# Altium schematic symbol library BARKO_SCHLIB.SchLib: 1064 symbols (part 11 of 11)
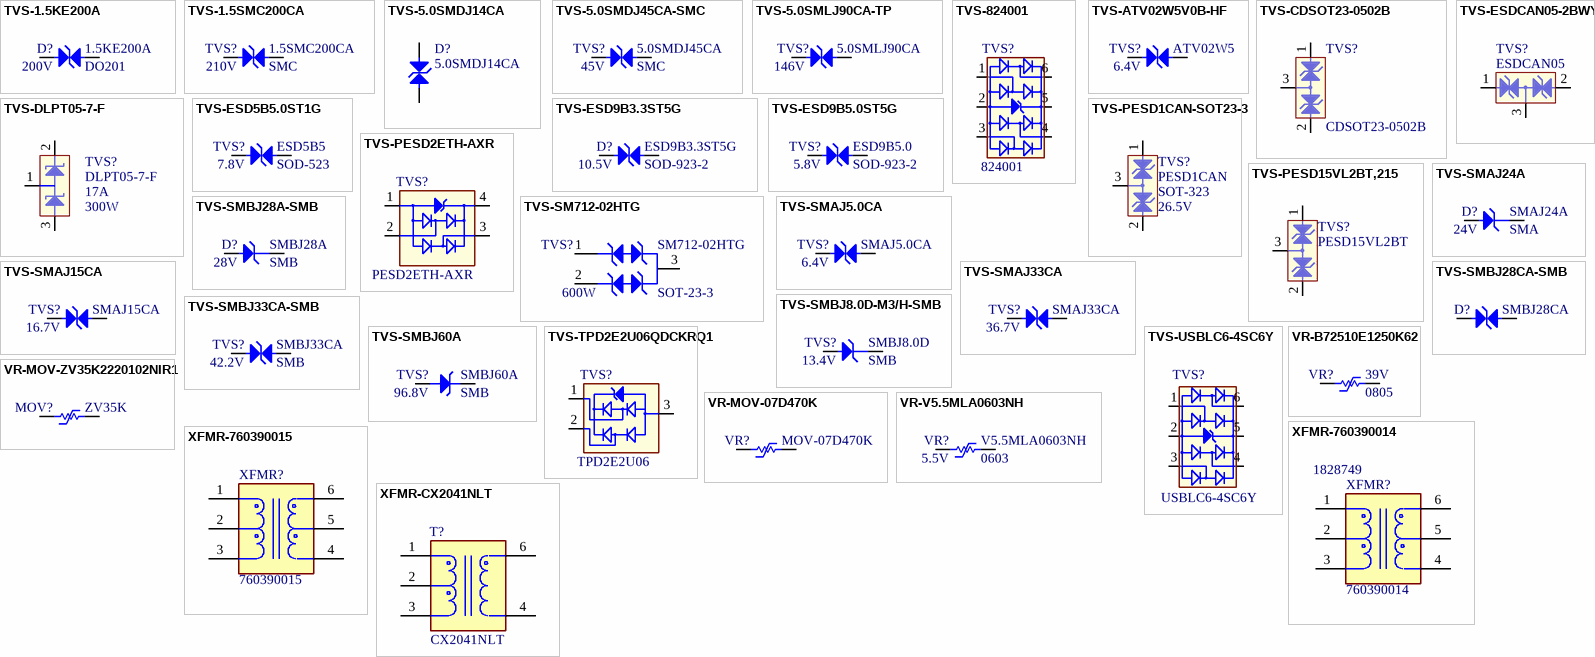
[diagram p51: symbols TVS-1.5KE200A to XFMR-CX2041NLT]

## TVS-USBLC6-4SC6Y
designator TVS?, comment USBLC6-4SC6Y
TVS DIODE 5.25V 17V SOT23-6; Manufacturer: STMicroelectronics; Direction: Unidirectional; Capacitance: 4pF; Min Breakdown Voltage: 6V; Power Line Protection: Yes; Leakage Current: 150nA; Peak Pulse Current: 5A; Number of Bidirectional Channels: 4; Supplier 1: Digi-Key; Supplier Part Number 1: 497-11883-1-ND; Manufacturer Part Number: USBLC6-4SC6Y; Stock: 26750; Pricing: 1=0.87, 10=0.737, 100=0.5762, 500=0.469, 1000=0.3752 (USD); RoHS: Yes; Mount: Surface Mount; Case/Package: SOT-23-6; Number of Pins: 6; Min Operating Temperature: -40°C; Max Operating Temperature: 150°C; Clamping Voltage: 17V; Package Quantity: 1; Packaging: Tape and Reel; Reverse Standoff Voltage: 5.25V; Length: 3mm; Depth: 1.75mm; Radiation Hardening: No; Lead Free: Lead Free; ComponentLink1URL: https://datasheet.ciiva.com/25956/dm00055251-25956716.pdf?src-supplier=Avnet+Europe; ComponentLink1Description: https://datasheet.ciiva.com/25956/dm00055251-25956716.pdf?src-supplier=Avnet+Europe; ComponentLink2URL: https://datasheet.ciiva.com/339/dm00055251-339152.pdf?src-supplier=Digi-Key; ComponentLink2Description: https://datasheet.ciiva.com/339/dm00055251-339152.pdf?src-supplier=Digi-Key; ComponentLink3URL: https://datasheet.ciiva.com/339/dm00055251-339153.pdf?src-supplier=Digi-Key; ComponentLink3Description: https://datasheet.ciiva.com/339/dm00055251-339153.pdf?src-supplier=Digi-Key; ComponentLink4URL: https://datasheet.ciiva.com/339/dm00055251-339154.pdf?src-supplier=Digi-Key; ComponentLink4Description: https://datasheet.ciiva.com/339/dm00055251-339154.pdf?src-supplier=Digi-Key
footprint SOT23-6L
pins: 1 I/O1, 2 GND, 3 I/O2, 4 I/O3, 5 VDD, 6 I/O4

## VR-B72510E1250K62
designator VR?, comment Varistor Voltage: 39V  Case Code (Imperial): 0805  (hidden comment: B72510E1250K62)
VARISTOR 39V 80A 0805; Manufacturer: TDK EPCOS; Capacitance: 250pF; Max Voltage Rating (AC): 25V; Max Voltage Rating (DC): 31V; Clamping Voltage: 67V; Clamping Current: 1A; Voltage Tolerance: 10%; Number of Circuits: 1; Energy: 0.3J; Min Varistor Voltage: 35.1V; Max Varistor Voltage: 42.9V; .Creator: F:TALI; .PCBCHK: USED; Washability: OK; Supplier 1: Digi-Key; Manufacturer Part Number: B72510E1250K62; Stock 1: 0; Mount: Surface Mount; Case/Package: 0805; Case Code (Metric): 2012; Min Operating Temperature: -55°C; Max Operating Temperature: 125°C; Max Surge Current: 80A; Packaging: Tape and Reel; Package Quantity: 1; Voltage Rating (DC): 31V; Voltage Rating (AC): 25V; Tolerance: 10%; Termination: SMD/SMT; Length: 2mm; Depth: 1.25mm; ComponentLink1URL: http://www.mouser.com/ds/2/400/Automotive_series-525688.pdf; ComponentLink1Description: http://www.mouser.com/ds/2/400/Automotive_series-525688.pdf; Supplier Part Number 1: 495-4614-1-ND; .SCHCHK: USED
footprint R-0805
pins: 1, 2

## VR-MOV-07D470K
designator VR?, comment MOV-07D470K
VARISTOR 47V 250A DISC 7MM; Manufacturer: Bourns; Capacitance: 1.1nF; Max Voltage Rating (DC): 38V; Max Voltage Rating (AC): 30V; Clamping Current: 2.5A; Voltage Rating (DC): 52V; Tolerance: 10%; Clamping Voltage: 93V; Number of Circuits: 1; Energy: 2.5J; Min Varistor Voltage: 42V; Lead/Base Style: Radial; .Creator: F:TALI; .PCBCHK: USED; Washability: OK; Supplier 1: Mouser; Manufacturer Part Number: MOV-07D470K; Stock 1: 2133; Pricing 1: 1=0.44, 10=0.245, 50=0.245, 100=0.185, 1000=0.08, 10000=0.052 (USD); Mount: Radial,Through Hole; Case/Package: Radial; Min Operating Temperature: -40°C; Max Operating Temperature: 85°C; Varistor Voltage: 47V; Packaging: Bulk; Max Surge Current: 250A; Package Quantity: 2000; Voltage Tolerance: 10%; Max Varistor Voltage: 52V; Voltage Rating (AC): 30V; Diameter: 7mm; Width: 6.8mm; Lead Pitch: 5mm; Depth: 3.8mm; Radiation Hardening: No; REACH SVHC: No SVHC; ComponentLink1URL: http://www.bourns.com/data/global/pdfs/MOV07D.pdf?src-supplier=Avnet; ComponentLink1Description: http://www.bourns.com/data/global/pdfs/MOV07D.pdf?src-supplier=Avnet; ComponentLink2URL: http://www.bourns.com/data/global/pdfs/MOV07D.pdf?src-supplier=Avnet+Europe; ComponentLink2Description: http://www.bourns.com/data/global/pdfs/MOV07D.pdf?src-supplier=Avnet+Europe; ComponentLink3URL: https://www.bourns.com/docs/Product-Datasheets/MOV07D.pdf?src-supplier=Digi-Key; ComponentLink3Description: https://www.bourns.com/docs/Product-Datasheets/MOV07D.pdf?src-supplier=Digi-Key; Supplier Part Number 1: 652-MOV-07D470K; .SCHCHK: USED
footprint VRS-7mm
pins: 1, 2

## VR-MOV-ZV35K2220102NIR1
designator MOV?, comment ZV35K
ZV 35V 10% 2220 NI SN; Manufacturer: Bourns; Manufacturer Part Number: ZV35K2220102NIR1; Supplier 1: Digi-Key; Supplier Part Number 1: 118-ZV35K2220102NIR1CT-ND; Stock: 963; Pricing: 1=0.92, 10=0.809, 25=0.716, 100=0.6237, 250=0.5428, 500=0.462 (USD)
footprint VR-2220 (2220, 2-Leads, Body 9.4x5.7mm, Pitch 6.7mm)
pins: 1, 2

## VR-V5.5MLA0603NH
designator VR?, comment V5.5MLA0603NH  Max Voltage Rating (DC): 5.5V  Case/Package: 0603
VARISTOR 8.2V 30A 0603; Manufacturer: Littelfuse; Number of Circuits: 1; Energy: 0.1J; Clamping Current: 1A; Voltage Rating (AC): 4V; Capacitance: 500pF; Min Varistor Voltage: 7.1V; Varistor Voltage: 9.3V; Clamping Voltage: 17.5V; .Creator: M.OZKAN; .PCBCHK: USED; Supplier 1: Digi-Key; Supplier Part Number 1: F3363CT-ND; Manufacturer Part Number: V5.5MLA0603NH; Stock: 17828; Pricing: 1=0.48, 10=0.407, 25=0.3564, 100=0.3056, 250=0.2649, 500=0.2241, 1000=0.1732 (USD); RoHS: Yes; Mount: Surface Mount; Case Code (Metric): 1608; Case Code (Imperial): 0603; Min Operating Temperature: -55°C; Max Operating Temperature: 125°C; Termination: SMD/SMT; Voltage Rating (DC): 5.5V; Max Surge Current: 30A; Package Quantity: 1; Packaging: Tape and Reel; Max Varistor Voltage: 9.3V; Voltage Rating: 5.5V; Max Output Current: 30A; Length: 1.6mm; Depth: 0.8mm; Width: 0.8mm; Thickness: 1mm; Lead Free: Lead Free; REACH SVHC: No SVHC; ComponentLink1URL: https://datasheet.ciiva.com/25604/0900766b8110fc50-25604612.pdf?src-supplier=RSComponents; ComponentLink1Description: https://datasheet.ciiva.com/25604/0900766b8110fc50-25604612.pdf?src-supplier=RSComponents; ComponentLink2URL: https://datasheet.ciiva.com/28500/771777-28500998.pdf?src-supplier=Element14; ComponentLink2Description: https://datasheet.ciiva.com/28500/771777-28500998.pdf?src-supplier=Element14; ComponentLink3URL: https://datasheet.ciiva.com/15155/getdatasheetpartid-152319-15155610.pdf?src-supplier=Verical; ComponentLink3Description: https://datasheet.ciiva.com/15155/getdatasheetpartid-152319-15155610.pdf?src-supplier=Verical; ComponentLink4URL: https://datasheet.ciiva.com/365/littelfuse-mlv-mla-365235.pdf?src-supplier=Digi-Key; ComponentLink4Description: https://datasheet.ciiva.com/365/littelfuse-mlv-mla-365235.pdf?src-supplier=Digi-Key; ComponentLink5URL: https://datasheet.ciiva.com/365/littelfuse-mlv-mla-365236.pdf?src-supplier=Digi-Key; ComponentLink5Description: https://datasheet.ciiva.com/365/littelfuse-mlv-mla-365236.pdf?src-supplier=Digi-Key; ComponentLink6URL: https://datasheet.ciiva.com/365/littelfuse-mlv-mla-365237.pdf?src-supplier=Digi-Key; ComponentLink6Description: https://datasheet.ciiva.com/365/littelfuse-mlv-mla-365237.pdf?src-supplier=Digi-Key; ComponentLink7URL: https://datasheet.ciiva.com/8070/575651-8070855.pdf?src-supplier=Element14; ComponentLink7Description: https://datasheet.ciiva.com/8070/575651-8070855.pdf?src-supplier=Element14; ComponentLink8URL: https://datasheet.ciiva.com/22712/575651-22712073.pdf?src-supplier=Element14; ComponentLink8Description: https://datasheet.ciiva.com/22712/575651-22712073.pdf?src-supplier=Element14; ComponentLink9URL: https://datasheet.ciiva.com/16378/littelfuse-ml-16378604.pdf?src-supplier=Future+Electronics; ComponentLink9Description: https://datasheet.ciiva.com/16378/littelfuse-ml-16378604.pdf?src-supplier=Future+Electronics; ComponentLink10URL: https://datasheet.ciiva.com/4540/littelfuse-varistor-mla-datasheet-pdf-357296-4540222.pdf?src-supplier=Mouser; ComponentLink10Description: https://datasheet.ciiva.com/4540/littelfuse-varistor-mla-datasheet-pdf-357296-4540222.pdf?src-supplier=Mouser; Max Voltage Rating (AC): 4V; .SCHCHK: USED
footprint R-0603
pins: 1, 2

## XFMR-760390014
designator XFMR?, comment 760390014  Supplier Part Number 1: 1828749
TRANSFORMER 475UH SMD; Manufacturer: Wurth Electronics; Frequency: 10kHz; DC Resistance (DCR): 370mR; Current Rating: 150mA; Isolation Voltage: 2.5kV; Supplier 1: RSComponents; Manufacturer Part Number: 760390014; Stock 1: 3780; Pricing 1: 1200=1.99200, 1200=15.32500 (EUR); RoHS: Yes; Mount: Surface Mount; Case/Package: SMD/SMT; Min Operating Temperature: -40°C; Max Operating Temperature: 125°C; Package Quantity: 1200; Packaging: Tape and Reel; Termination: SMD/SMT; Inductance: 475uH; Max DC Current: 150mA; Length: 10.05mm; Width: 10.05mm; Height: 4.19mm; Height - Seated (Max): 4.19mm; ComponentLink1URL: https://datasheet.ciiva.com/12335/760390014-221199-12335395.pdf?src-supplier=Mouser; ComponentLink1Description: https://datasheet.ciiva.com/12335/760390014-221199-12335395.pdf?src-supplier=Mouser
footprint T-760390015 (760390015)
pins: 1, 2, 3, 4, 5, 6

## XFMR-760390015
designator XFMR?, comment 760390015
TRANSFORMER 475UH SMD; Manufacturer: Wurth Electronics; DC Resistance (DCR): 570mR; Frequency: 10kHz; Isolation Voltage: 2.5kV; Max DC Current: 150mA; Supplier 1: RSComponents; Manufacturer Part Number: 760390015; Stock 1: 35; Pricing 1: 5=2,20700, 25=2,05100, 100=1,93700, 250=1,86900, 500=1,74700, 5=16,98000, 25=15,78000, 100=14,90000, 250=14,38000, 500=13,44000 (EUR); RoHS: Yes; Mount: Surface Mount; Case/Package: SMD/SMT; Min Operating Temperature: -40°C; Max Operating Temperature: 125°C; Package Quantity: 1200; Termination: SMD/SMT; Packaging: Tape and Reel; Inductance: 475uH; Current Rating: 150mA; Length: 10.05mm; Height: 4.19mm; Width: 10.05mm; Height - Seated (Max): 4.19mm; ComponentLink1URL: https://datasheet.ciiva.com/12335/760390015-221218-12335392.pdf?src-supplier=Mouser; ComponentLink1Description: https://datasheet.ciiva.com/12335/760390015-221218-12335392.pdf?src-supplier=Mouser; Supplier Part Number 1: 1828986
footprint T-760390015 (760390015)
pins: 1, 2, 3, 4, 5, 6

## XFMR-CX2041NLT
designator T?, comment CX2041NLT
BALUN 50KHZ-450MHZ 75/75 5SMD; Manufacturer: Pulse; Insertion Loss: 0.6dB; Frequency: 1.5GHz; Turns Ratio: 1:1; Washability: OK; .Creator: M.OZKAN; .PCBCHK: USED; Supplier 1: Digi-Key; Supplier Part Number 1: 553-2290-1-ND; Manufacturer Part Number: CX2041NLT; Stock: 5174; Pricing: 1=2.97, 10=2.376, 25=1.9304, 50=1.881, 100=1.8315, 250=1.782, 500=1.7672, 1000=1.5642 (USD); RoHS: Yes; Mount: Surface Mount; Case/Package: SMD/SMT; Number of Pins: 5; Min Operating Temperature: -40°C; Max Operating Temperature: 85°C; Packaging: Tape and Reel; Package Quantity: 2000; Length: 3.81mm; Depth: 3.81mm; Radiation Hardening: No; ComponentLink1URL: https://datasheet.ciiva.com/2788/+c203-2788942.pdf?src-supplier=Digi-Key; ComponentLink1Description: https://datasheet.ciiva.com/2788/+c203-2788942.pdf?src-supplier=Digi-Key; .SCHCHK: USED
footprint T-CX2041NL
pins: 1, 2, 3, 4, 6